# Altium footprint library Basal.PcbLib: 248 footprints (part 15 of 16)
Each footprint in its own frame and in the unit in brackets; x right, y up, seen from the top. Pads: shape width x height; smd on the part's side, far side on the other; paste and mask are expansions set on the pad; w line width, h text height; cw(c..) or ccw(c..) is an arc to the next point about the centre after c.
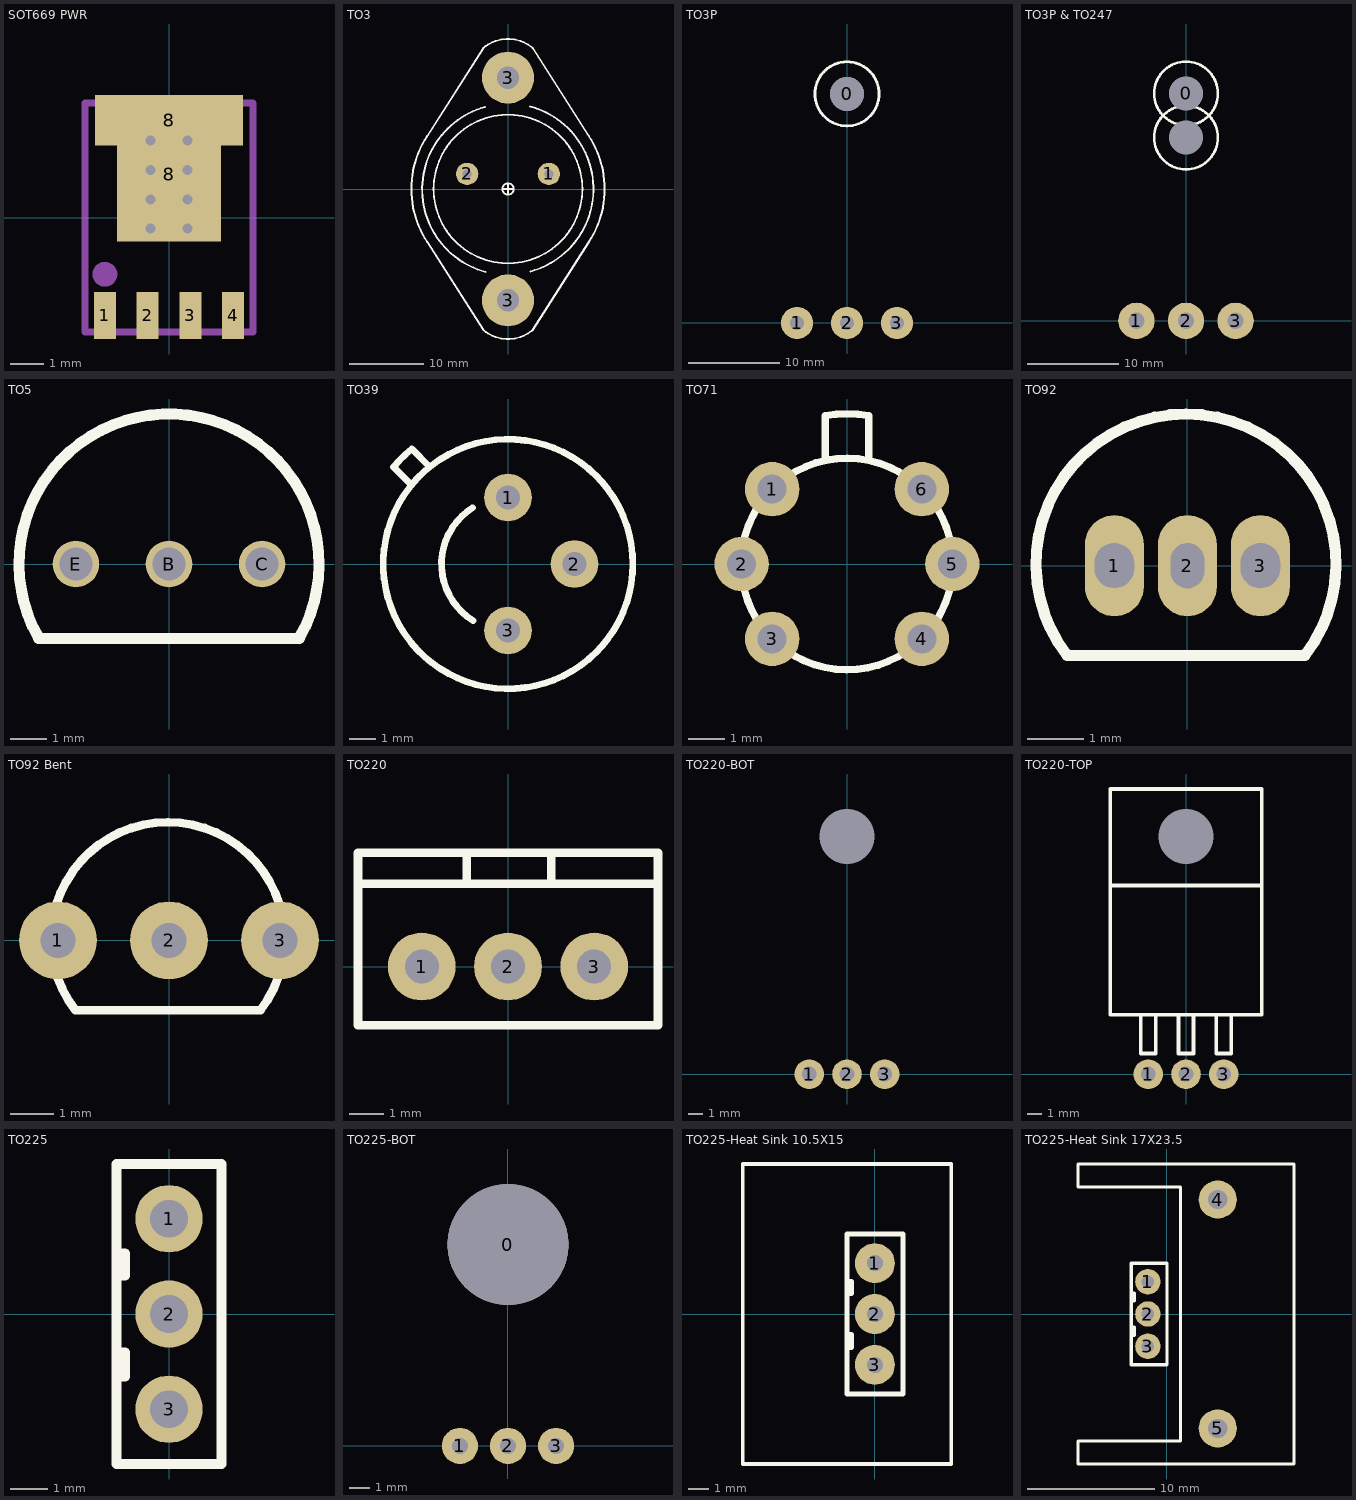
[diagram p14: the footprints below, top view; thin cyan lines are the x and y axes]

## SOT669 PWR [mm] "SOP, 8-Leads, Pitch 1.27mm"
pads (6):
  rect 0.65x1.4 smd: 1(-1.905,-2.9) 2(-0.635,-2.9) 3(0.635,-2.9) 4(1.905,-2.9)
  rect 3.1x4 smd paste-5: 8(0,1.3)
  rect 4.4x1.5 smd paste-5: 8(0,2.9)
via 0.549,-0.321 diameter 0.6 hole 0.3
via -0.551,-0.321 diameter 0.6 hole 0.3
via 0.549,0.551 diameter 0.6 hole 0.3
via -0.551,0.551 diameter 0.6 hole 0.3
via 0.549,1.423 diameter 0.6 hole 0.3
via -0.551,1.423 diameter 0.6 hole 0.3
via 0.549,2.295 diameter 0.6 hole 0.3
via -0.551,2.295 diameter 0.6 hole 0.3
Top Paste:
  region: 0.289,-0.169 0.289,0.39 -0.291,0.39 -0.291,-0.169
  region: -0.811,-0.169 -0.811,0.39 -1.391,0.39 -1.391,-0.169
  region: 1.389,-0.169 1.389,0.39 0.809,0.39 0.809,-0.169
  region: 1.389,0.703 1.389,1.262 0.809,1.262 0.809,0.703
  region: -0.811,0.703 -0.811,1.262 -1.391,1.262 -1.391,0.703
  region: 0.289,0.703 0.289,1.262 -0.291,1.262 -0.291,0.703
  region: -0.975,1.576 -0.975,2.205 -1.476,2.205 -1.476,1.576
  region: 0.289,1.576 0.289,2.134 -0.291,2.134 -0.291,1.576
  region: -0.811,-0.677 -0.811,-0.482 -1.391,-0.482 -1.391,-0.677
  region: 0.289,-0.677 0.289,-0.482 -0.291,-0.482 -0.291,-0.677
  region: 1.389,-0.677 1.389,-0.482 0.809,-0.482 0.809,-0.677
  region: 2.146,2.734 2.146,3.604 -2.146,3.604 -2.146,2.734
  region: -0.978,2.197 -0.978,2.748 -2.146,2.748 -2.146,2.197
  region: 2.144,2.197 2.144,2.748 0.976,2.748 0.976,2.197
  region: 1.474,1.576 1.474,2.205 0.973,2.205 0.973,1.576
Mechanical 15:
  circle w0.381: c-1.905,-1.676 r0.178
  lines w0.203: -2.5,-3.388 -2.5,3.412 2.5,3.412 2.5,-3.388 -2.5,-3.388
3D body "SOT669.STEP": height 1.2, standoff 0, extent -2.5,-3.372 2.5,3.395

## TO3 [mm]
pads (4):
  round 3 hole 1.2: 1(5.5,2.032) 2(-5.5,2.032)
  round 7 hole 3: 3(0,-14.986) 3(0,14.986)
Top Overlay:
  circle w0.254: c0,-15 r2
  circle w0.254: c0,15 r2
  circle w0.254: c0,0 r10
  circle w0.254: c0,0 r0.762
  lines w0.254: -10.952,6.987 -3.301,18.98 ; -10.891,7.106 ccw(c0,0) -10.882,-7.119 ; -10.866,-7.093 -3.287,-18.973 ; -3.31,18.992 cw(c0,15) 3.321,18.983 ; -3.305,-18.996 ccw(c0,-15) 3.317,-18.986 ; -3.077,11.044 ccw(c-0.051,-0.051) -2.995,-11.168 ; -0.762,0 0.762,0 ; 0,-0.762 0,0.762 ; 2.944,11.117 cw(c0,0) 3.026,-11.095 ; 3.307,-19.018 10.903,-7.112 ; 3.315,18.975 10.881,7.115 ; 10.882,7.119 cw(c0,0) 10.891,-7.106
3D body "TO-3_Short.STEP": height 8.5, standoff -3, extent -13.114,-19.579 13.064,20.011

## TO3P [mm]
pads (4):
  round 3.7 hole 3.7: 0(0,25)
  round 3.5 hole 1.5: 1(-5.45,0) 2(0,0) 3(5.45,0)
Top Overlay:
  circle w0.3: c0,25 r3.5
Bottom Overlay:
  lines w0.254: -10.25,5 10.25,5 10.25,30.988 -10.25,30.988 -10.25,5
3D body "TO-247AC_bent_leads.STEP": height 7.05, standoff -5.75, extent -7.95,-0.25 7.95,25.65
3D body: height -0.4, standoff -5.8, extent -10.262,5.004 10.262,30.988
3D body: height -0.39, standoff -5.81, extent -1.75,23.25 1.75,26.75

## TO3P & TO247 [mm]
pads (5):
  round 0 hole 3.7: 0(0,20.15)
  round 3.7 hole 3.7: 0(0,25)
  round 4 hole 1.8: 1(-5.45,0) 2(0,0) 3(5.45,0)
Top Overlay:
  circle w0.3: c0,25 r3.5
  circle w0.3: c0,20.15 r3.5
Bottom Overlay:
  lines w0.254: -6.5,5.3 -6.5,1.3 -4.4,1.3 -4.4,5.3 ; -1.5,5.3 -1.5,1.3 1.5,1.3 1.5,5.3 ; 4.4,5.3 4.4,1.3 6.5,1.3 6.5,5.3 ; -10.25,5 -10.25,30.988 10.25,30.988 10.25,5 -10.25,5 ; -7.95,5.3 7.95,5.3 7.95,26 -7.95,26 -7.95,5.3
3D body: height -0.39, standoff -5.81, extent -1.75,18.4 1.75,21.9
3D body "TO-247AC_bent_leads.STEP": height 7.05, standoff -5.75, extent -7.95,-0.25 7.95,25.65
3D body: height -0.39, standoff -5.81, extent -1.75,23.25 1.75,26.75
3D body: height -0.4, standoff -5.8, extent -10.262,5.004 10.262,30.988

## TO5 [mm]
pads (3):
  round 1.27 hole 0.9: B(0,0) C(2.54,0) E(-2.54,0)
Top Overlay:
  lines w0.305: -3.556,-2.032 cw(c0,0) 3.556,-2.032 -3.556,-2.032
3D body "User Library-TO92.STEP": height 9.7, standoff -1.6, extent -2.74,-1.575 2.791,2.503

## TO39 [mm]
pads (3):
  round 1.8 hole 0.9: 1(0,2.504) 2(2.504,0) 3(0,-2.504)
Top Overlay:
  circle w0.254: c0,0 r4.7
  lines w0.254: -3.658,2.997 -4.311,3.652 cw(c0,0) -3.622,4.336 -2.946,3.658 ; -1.341,2.115 ccw(c0,0) -1.31,-2.134

## TO71 [mm]
pads (6):
  round 1.5 hole 0.8: 1(-2.065,2.065) 2(-2.91,0) 3(-2.065,-2.065) 4(2.065,-2.065) 5(2.91,0) 6(2.065,2.065)
Top Overlay:
  lines w0.203: -0.6,2.86 -0.6,4.097 ; -0.596,4.097 cw(c0,0) 0.596,4.097 ; 0.6,2.86 0.6,4.097 ; 0.6,2.858 ccw(c0,0) 0.6,2.858

## TO92 [mm]
pads (3):
  oval 1.05x1.8 hole 0.7 slot 0.8 at 90 deg: 1(-1.3,0) 3(1.3,0)
  oval 1.05x1.8 hole 0.6 slot 0.8 at 90 deg: 2(0,0)
Top Overlay:
  lines w0.2: -2.144,-1.6 2.093,-1.6 ; -2.144,-1.595 cw(c-0.025,0.03) 2.093,-1.595
3D body "TO92_Str.STEP": height 10, standoff -3, extent -2.613,-1.59 2.613,2.613

## TO92 Bent [mil]
pads (3):
  round 70 hole 31.5: 1(-100,0) 2(0,0) 3(100,0)
Top Overlay:
  lines w7.87: -84.4,-62.99 82.4,-62.99 ; -84.4,-62.81 cw(c-1,1.18) 82.4,-62.81
3D body "TO92 Bent.STEP": height 393.7, standoff -118.11, extent -109.83,-62.61 109.85,102.88

## TO220 [mm]
pads (3):
  round 2 hole 1: 1(-2.54,0) 2(0,0) 3(2.54,0)
Top Overlay:
  lines w0.254: -4.42,2.438 4.369,2.438 4.42,2.489 ; -1.219,2.438 -1.219,3.353 ; 1.27,2.438 1.27,3.302 ; -4.42,-1.727 -4.42,3.353 4.42,3.353 4.42,-1.727 -4.42,-1.727
3D body "TO-220HS.STEP": height 18.54, standoff -3.81, extent -5.08,-1.448 5.08,3.124

## TO220-BOT [mm]
pads (4):
  round 0 hole 3.7: 0(0,16)
  round 2 hole 1: 1(-2.54,0) 2(0,0) 3(2.54,0)
Bottom Overlay:
  lines w0.254: -5.1,12.7 5.1,12.7 ; -3.048,4 -3.048,1.397 -2.032,1.397 -2.032,4 ; -0.508,4 -0.508,1.397 0.508,1.397 0.508,4 ; 2.032,4 2.032,1.397 3.048,1.397 3.048,4 ; -5.1,4 -5.1,19.2 5.1,19.2 5.1,4 -5.1,4
3D body "TO-220-BOTTOM.STEP": height 2, standoff -5, extent -5.08,-0.254 5.08,19.236

## TO220-TOP [mm]
pads (4):
  round 0 hole 3.7: 0(0,16)
  round 2 hole 1: 1(-2.54,0) 2(0,0) 3(2.54,0)
Top Overlay:
  lines w0.254: -5.1,12.7 5.1,12.7 ; -3.048,4 -3.048,1.397 -2.032,1.397 -2.032,4 ; -0.508,4 -0.508,1.397 0.508,1.397 0.508,4 ; 2.032,4 2.032,1.397 3.048,1.397 3.048,4 ; -5.1,4 5.1,4 5.1,19.2 -5.1,19.2 -5.1,4
3D body "TO-220S.STEP": height 4.2, standoff -3, extent -5.08,-0.254 5.08,19.236

## TO225 [mm]
pads (3):
  round 1.8 hole 1: 1(0,2.54) 2(0,0) 3(0,-2.54)
Top Overlay:
  lines w0.254: -1.4,-4 1.4,-4 1.4,4 -1.4,4 -1.4,-3.998 ; -1.4,-1.676 -1.168,-1.676 -1.168,-1.016 -1.4,-1.016 ; -1.4,1.016 -1.168,1.016 -1.168,1.626 -1.4,1.626

## TO225-BOT [mm]
pads (4):
  round 6 hole 6: 0(0,10)
  round 1.8 hole 0.8: 1(-2.39,0) 2(0,0) 3(2.39,0)
Bottom Overlay:
  lines w0.254: -3.85,3 -3.85,14 3.85,14 3.85,3 -3.85,3

## TO225-Heat Sink 10.5X15 [mm]
pads (3):
  round 2 hole 0.8: 1(0,2.54) 2(0,0) 3(0,-2.54)
Top Overlay:
  lines w0.178: -6.6,-7.5 3.81,-7.5 3.81,7.5 -6.6,7.5 -6.6,-7.5
  lines w0.254: -1.4,-4 1.4,-4 1.4,4 -1.4,4 -1.4,-3.998 ; -1.4,-1.676 -1.168,-1.676 -1.168,-1.016 -1.4,-1.016 ; -1.4,1.016 -1.168,1.016 -1.168,1.626 -1.4,1.626

## TO225-Heat Sink 17X23.5 [mm]
pads (5):
  round 2 hole 1: 1(-1.5,2.54) 2(-1.5,0) 3(-1.5,-2.54)
  round 3 hole 1.5: 4(4,9) 5(4,-9)
Top Overlay:
  lines w0.254: -2.8,-4 0,-4 0,4 -2.8,4 -2.8,-3.998 ; -2.8,-1.676 -2.568,-1.676 -2.568,-1.016 -2.8,-1.016 ; -2.8,1.016 -2.568,1.016 -2.568,1.626 -2.8,1.626 ; -7,-11.8 10,-11.8 10,11.8 -7,11.8 -7,10 1.067,10 1.067,-10 -7,-10 -7,-11.8